# Altium integrated library 兰格封装.IntLib: 1176 symbols (part 5 of 6)
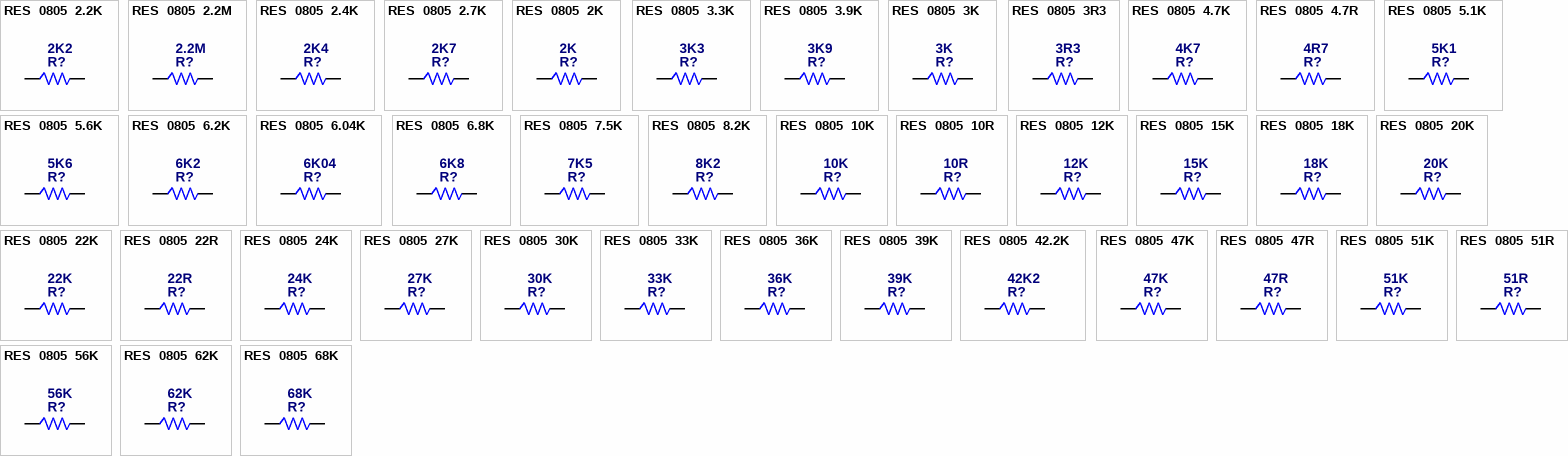
[diagram p52: symbols RES  0805  2.2K to RES  0805  68K]

## RES  0805  39K
designator R?, comment 39K
0805  39K  5%  HS  贴片电阻; 物料代码: 3.01.03.01.02.0043; 助记码: 0805  39K  5%  HS  TPDZ; 仓库名称: 元件仓; 单位: ֻ; 加工方式: 贴片; 物料名称: 0805  39K  5%  HS  贴片电阻; 规格型号: *
footprint R0805
pins: 1, 2
2 alternate drawings of the same symbol

## RES  0805  42.2K
designator R?, comment 42K2
0805 42.2K 1% HS 贴片电阻; 物料代码: 3.01.03.01.02.0074; 仓库名称: 元件仓; 助记码: 0805 42.2K 1% HS TPD; 单位: ֻ; 加工方式: 贴片; 物料名称: 0805 42.2K 1% HS 贴片电阻; 规格型号: *
footprint R0805
pins: 1, 2
2 alternate drawings of the same symbol

## RES  0805  47K
designator R?, comment 47K
0805  47K  5%  HS  贴片电阻; 物料代码: 3.01.03.01.02.0044; 仓库名称: 元件仓; 助记码: 0805  47K  5%  HS  TPDZ; 单位: ֻ; 加工方式: 贴片; 物料名称: 0805  47K  5%  HS  贴片电阻; 规格型号: *
footprint R0805
pins: 1, 2
2 alternate drawings of the same symbol

## RES  0805  47R
designator R?, comment 47R
0805  47R  5%  HS  贴片电阻; 物料代码: 3.01.03.01.02.0009; 单位: ֻ; 助记码: 0805  47R  5%  HS  TPDZ; 仓库名称: 元件仓; 加工方式: 贴片; 物料名称: 0805  47R  5%  HS  贴片电阻; 规格型号: *
footprint R0805
pins: 1, 2
2 alternate drawings of the same symbol

## RES  0805  51K
designator R?, comment 51K
0805  51K  5%  HS  贴片电阻; 物料代码: 3.01.03.01.02.0045; 仓库名称: 元件仓; 助记码: 0805  51K  5%  HS  TPDZ; 单位: ֻ; 加工方式: 贴片; 物料名称: 0805  51K  5%  HS  贴片电阻; 规格型号: *
footprint R0805
pins: 1, 2
2 alternate drawings of the same symbol

## RES  0805  51R
designator R?, comment 51R
0805  51R  5%  HS  贴片电阻; 助记码: 0805  51R  5%  HS  TPDZ; 单位: ֻ; 物料代码: 3.01.03.01.02.0064; 仓库名称: 元件仓; 加工方式: 贴片; 物料名称: 0805  51R  5%  HS  贴片电阻; 规格型号: *
footprint R0805
pins: 1, 2
2 alternate drawings of the same symbol

## RES  0805  56K
designator R?, comment 56K
0805 56K 5% HS 贴片电阻; 物料代码: 3.01.03.01.02.0046; 仓库名称: 元件仓; 助记码: 0805 56K 5% HS TPDZ; 单位: ֻ; 加工方式: 贴片; 物料名称: 0805 56K 5% HS 贴片电阻; 规格型号: *
footprint R0805
pins: 1, 2
2 alternate drawings of the same symbol

## RES  0805  62K
designator R?, comment 62K
0805 62K 5% HS 贴片电阻; 物料代码: 3.01.03.01.02.0047; 助记码: 0805 62K 5% HS TPDZ; 仓库名称: 元件仓; 单位: ֻ; 加工方式: 贴片; 物料名称: 0805 62K 5% HS 贴片电阻; 规格型号: *
footprint R0805
pins: 1, 2
2 alternate drawings of the same symbol

## RES  0805  68K
designator R?, comment 68K
0805  68K  5%  HS  贴片电阻; 物料代码: 3.01.03.01.02.0048; 助记码: 0805  68K  5%  HS  TPDZ; 仓库名称: 元件仓; 单位: ֻ; 加工方式: 贴片; 物料名称: 0805  68K  5%  HS  贴片电阻; 规格型号: *
footprint R0805
pins: 1, 2
2 alternate drawings of the same symbol

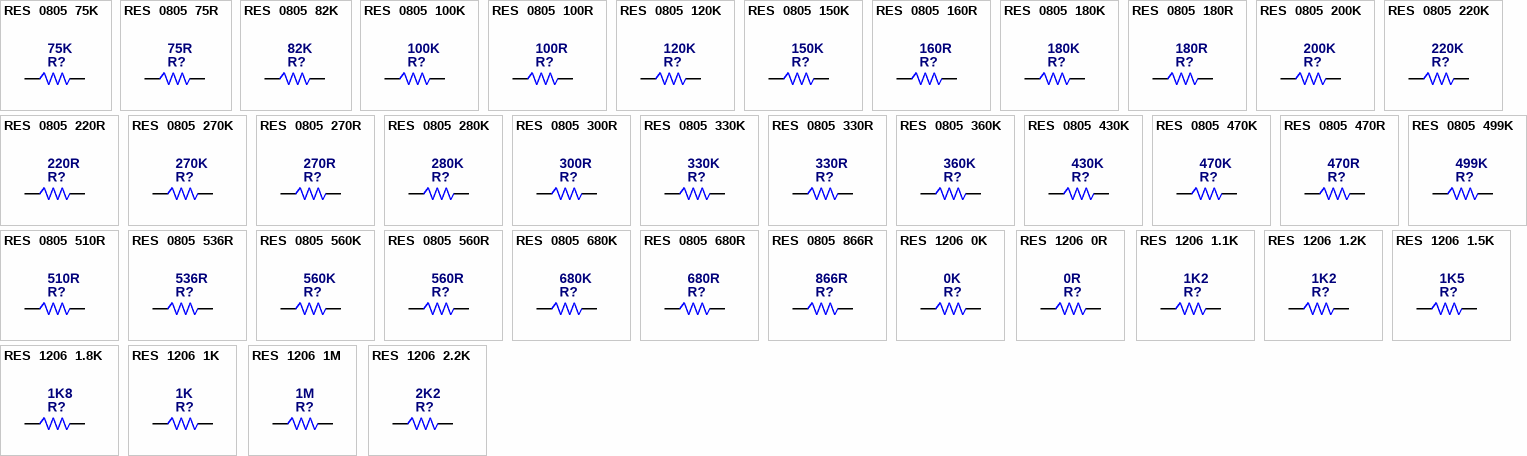
[diagram p40: symbols RES  0805  75K to RES  1206  2.2K]

## RES  0805  75K
designator R?, comment 75K
0805 75K 5% HS 贴片电阻; 物料代码: 3.01.03.01.02.0049; 助记码: 0805 75K 5% HS TPDZ; 仓库名称: 元件仓; 单位: ֻ; 加工方式: 贴片; 物料名称: 0805 75K 5% HS 贴片电阻; 规格型号: *
footprint R0805
pins: 1, 2
2 alternate drawings of the same symbol

## RES  0805  75R
designator R?, comment 75R
0805 75R 5% HS贴片电阻; 物料代码: 3.01.03.01.02.0010; 助记码: 0805 75R 5% HSTPDZ; 仓库名称: 元件仓; 单位: ֻ; 加工方式: 贴片; 物料名称: 0805 75R 5% HS贴片电阻; 规格型号: *
footprint R0805
pins: 1, 2
2 alternate drawings of the same symbol

## RES  0805  82K
designator R?, comment 82K
0805 82K 5% HS 贴片电阻; 物料代码: 3.01.03.01.02.0050; 助记码: 0805 82K 5% HS TPDZ; 仓库名称: 元件仓; 单位: ֻ; 加工方式: 贴片; 物料名称: 0805 82K 5% HS 贴片电阻; 规格型号: *
footprint R0805
pins: 1, 2
2 alternate drawings of the same symbol

## RES  0805  100K
designator R?, comment 100K
0805  100K  5%  HS  贴片电阻; 助记码: 0805  100K  5%  HS  TPDZ; 物料代码: 3.01.03.01.02.0005; 仓库名称: 元件仓; 单位: ֻ; 加工方式: 贴片; 物料名称: 0805  100K  5%  HS  贴片电阻; 规格型号: *
footprint R0805
pins: 1, 2
2 alternate drawings of the same symbol

## RES  0805  100R
designator R?, comment 100R
0805  100R  5%  HS  贴片电阻; 物料代码: 3.01.03.01.02.0011; 仓库代码: 元件仓; 助记码: 0805  100R  5%  HS  TPDZ; 单位: ֻ; 加工方式: 贴片; 仓库名称: 0805  100R  5%  HS  贴片电阻; 规格型号: *
footprint R0805
pins: 1, 2
2 alternate drawings of the same symbol

## RES  0805  120K
designator R?, comment 120K
0805  120K  5%  HS  贴片电阻; 助记码: 0805  120K  5%  HS  TPDZ; 物料代码: 3.01.03.01.02.0051; 仓库名称: 元件仓; 单位: ֻ; 加工方式: 贴片; 物料名称: 0805  120K  5%  HS  贴片电阻; 规格型号: *
footprint R0805
pins: 1, 2
2 alternate drawings of the same symbol

## RES  0805  150K
designator R?, comment 150K
0805  150K  5%  HS  贴片电阻; 助记码: 0805  150K  5%  HS  TPDZ; 物料代码: 3.01.03.01.02.0052; 仓库名称: 元件仓; 单位: ֻ; 加工方式: 贴片; 物料名称: 0805  150K  5%  HS  贴片电阻; 规格型号: *
footprint R0805
pins: 1, 2
2 alternate drawings of the same symbol

## RES  0805  160R
designator R?, comment 160R
0805 160R 5% HS 贴片电阻; 物料代码: 3.01.03.01.02.0068; 仓库名称: 元件仓; 助记码: 0805 160R 5% HS TPDZ; 单位: ֻ; 加工方式: 贴片; 物料名称: 0805 160R 5% HS 贴片电阻; 规格型号: *
footprint R0805
pins: 1, 2
2 alternate drawings of the same symbol

## RES  0805  180K
designator R?, comment 180K
0805 180K 5% HS 贴片电阻; 助记码: 0805 180K 5% HS TPDZ; 物料代码: 3.01.03.01.02.0053; 仓库名称: 元件仓; 单位: ֻ; 加工方式: 贴片; 物料名称: 0805 180K 5% HS 贴片电阻; 规格型号: *
footprint R0805
pins: 1, 2
2 alternate drawings of the same symbol

## RES  0805  180R
designator R?, comment 180R
0805 180R 5% HS 贴片电阻; 助记码: 0805 180R 5% HS TPDZ; 物料代码: 3.01.03.01.02.0069; 仓库名称: 元件仓; 单位: ֻ; 加工方式: 贴片; 物料名称: 0805 180R 5% HS 贴片电阻; 规格型号: *
footprint R0805
pins: 1, 2
2 alternate drawings of the same symbol

## RES  0805  200K
designator R?, comment 200K
0805 200K 5% HS 贴片电阻; 物料代码: 3.01.03.01.02.0054; 助记码: 0805 200K 5% HS TPDZ; 仓库名称: 元件仓; 单位: ֻ; 加工方式: 贴片; 物料名称: 0805 200K 5% HS 贴片电阻; 规格型号: *
footprint R0805
pins: 1, 2
2 alternate drawings of the same symbol

## RES  0805  220K
designator R?, comment 220K
0805  220K  5%  HS  贴片电阻; 物料代码: 3.01.03.01.02.0055; 助记码: 0805  220K  5%  HS  TPDZ; 仓库名称: 元件仓; 单位: ֻ; 加工方式: 贴片; 物料名称: 0805  220K  5%  HS  贴片电阻; 规格型号: *
footprint R0805
pins: 1, 2
2 alternate drawings of the same symbol

## RES  0805  220R
designator R?, comment 220R
0805  220R  5%  HS  贴片电阻; 物料代码: 3.01.03.01.02.0012; 助记码: 0805  220R  5%  HS  TPDZ; 仓库名称: 元件仓; 单位: ֻ; 加工方式: 贴片; 物料名称: 0805  220R  5%  HS  贴片电阻; 规格型号: *
footprint R0805
pins: 1, 2
2 alternate drawings of the same symbol

## RES  0805  270K
designator R?, comment 270K
0805  270K  5%  HS  贴片电阻; 助记码: 0805  270K  5%  HS  TPDZ; 仓库名称: 元件仓; 物料代码: 3.01.03.01.02.0056; 单位: ֻ; 加工方式: 贴片; 物料名称: 0805  270K  5%  HS  贴片电阻; 规格型号: *
footprint R0805
pins: 1, 2
2 alternate drawings of the same symbol

## RES  0805  270R
designator R?, comment 270R
0805  270R  5%  HS  贴片电阻; 物料代码: 3.01.03.01.02.0013; 助记码: 0805  270R  5%  HS  TPDZ; 仓库名称: 元件仓; 单位: ֻ; 加工方式: 贴片; 物料名称: 0805  270R  5%  HS  贴片电阻; 规格型号: *
footprint R0805
pins: 1, 2
2 alternate drawings of the same symbol

## RES  0805  280K
designator R?, comment 280K
0805 280K 1% HS 贴片电阻; 助记码: 0805 280K 1% HS TPDZ; 仓库名称: 元件仓; 物料代码: 3.01.03.01.02.0075; 单位: ֻ; 加工方式: 贴片; 物料名称: 0805 280K 1% HS 贴片电阻; 规格型号: *
footprint R0805
pins: 1, 2
2 alternate drawings of the same symbol

## RES  0805  300R
designator R?, comment 300R
0805 300R 5% HS 贴片电阻; 物料代码: 3.01.03.01.02.0014; 助记码: 0805 300R 5% HS TPDZ; 仓库名称: 元件仓; 单位: ֻ; 加工方式: 贴片; 物料名称: 0805 300R 5% HS 贴片电阻; 规格型号: *
footprint R0805
pins: 1, 2
2 alternate drawings of the same symbol

## RES  0805  330K
designator R?, comment 330K
0805  330K  5%  HS  贴片电阻; 助记码: 0805  330K  5%  HS  TPDZ; 物料代码: 3.01.03.01.02.0057; 仓库名称: 元件仓; 单位: ֻ; 加工方式: 贴片; 物料名称: 0805  330K  5%  HS  贴片电阻; 规格型号: *
footprint R0805
pins: 1, 2
2 alternate drawings of the same symbol

## RES  0805  330R
designator R?, comment 330R
0805  330R  5%  HS  贴片电阻; 物料代码: 3.01.03.01.02.0015; 助记码: 0805  330R  5%  HS  TPDZ; 仓库名称: 元件仓; 单位: ֻ; 加工方式: 贴片; 物料名称: 0805  330R  5%  HS  贴片电阻; 规格型号: *
footprint R0805
pins: 1, 2
2 alternate drawings of the same symbol

## RES  0805  360K
designator R?, comment 360K
0805 360K 5% HS 贴片电阻; 助记码: 0805 360K 5% HS TPDZ; 物料代码: 3.01.03.01.02.0058; 仓库名称: 元件仓; 单位: ֻ; 加工方式: 贴片; 物料名称: 0805 360K 5% HS 贴片电阻; 规格型号: *
footprint R0805
pins: 1, 2
2 alternate drawings of the same symbol

## RES  0805  430K
designator R?, comment 430K
0805  430K  5%  HS  贴片电阻; 助记码: 0805  430K  5%  HS  TPDZ; 物料代码: 3.01.03.01.02.0059; 仓库名称: 元件仓; 单位: ֻ; 加工方式: 贴片; 物料名称: 0805  430K  5%  HS  贴片电阻; 规格型号: *
footprint R0805
pins: 1, 2
2 alternate drawings of the same symbol

## RES  0805  470K
designator R?, comment 470K
0805 470K 5% HS 贴片电阻; 物料代码: 3.01.03.01.02.0060; 助记码: 0805 470K 5% HS TPDZ; 仓库名称: 元件仓; 单位: ֻ; 加工方式: 贴片; 物料名称: 0805 470K 5% HS 贴片电阻; 规格型号: *
footprint R0805
pins: 1, 2
2 alternate drawings of the same symbol

## RES  0805  470R
designator R?, comment 470R
0805  470R  5%  HS  贴片电阻; 物料代码: 3.01.03.01.02.0016; 助记码: 0805  470R  5%  HS  TPDZ; 仓库名称: 元件仓; 单位: ֻ; 加工方式: 贴片; 物料名称: 0805  470R  5%  HS  贴片电阻; 规格型号: *
footprint R0805
pins: 1, 2
2 alternate drawings of the same symbol

## RES  0805  499K
designator R?, comment 499K
0805 499K 1% HS 贴片电阻; 物料代码: 3.01.03.01.02.0077; 助记码: 0805 499K 1% HS TPDZ; 仓库名称: 元件仓; 单位: ֻ; 加工方式: 贴片; 物料名称: 0805 499K 1% HS 贴片电阻; 规格型号: *
footprint R0805
pins: 1, 2
2 alternate drawings of the same symbol

## RES  0805  510R
designator R?, comment 510R
0805 510R 1% HS 贴片电阻; 物料代码: 3.01.03.01.02.0076; 仓库名称: 元件仓; 助记码: 0805  510R  5%  HS  TPDZ; 单位: ֻ; 加工方式: 贴片; 物料名称: 0805 510R 1% HS 贴片电阻; 规格型号: *
footprint R0805
pins: 1, 2
2 alternate drawings of the same symbol

## RES  0805  536R
designator R?, comment 536R
0805 536R 1% HS 贴片电阻; 物料代码: 3.01.03.01.02.0070; 仓库名称: 元件仓; 助记码: 0805 536R 1% HS TPDZ; 单位: ֻ; 加工方式: 贴片; 物料名称: 0805 536R 1% HS 贴片电阻; 规格型号: *
footprint R0805
pins: 1, 2
2 alternate drawings of the same symbol

## RES  0805  560K
designator R?, comment 560K
0805 560K 5% HS  贴片电阻; 物料代码: 3.01.03.01.02.0061; 仓库名称: 元件仓; 助记码: 0805 560K 5% HS  TPDZ; 单位: ֻ; 加工方式: 贴片; 物料名称: 0805 560K 5% HS  贴片电阻; 规格型号: *
footprint R0805
pins: 1, 2
2 alternate drawings of the same symbol

## RES  0805  560R
designator R?, comment 560R
0805  560R  5%  HS  贴片电阻; 物料代码: 3.01.03.01.02.0017; 仓库名称: 元件仓; 助记码: 0805  560R  5%  HS  TPDZ; 单位: ֻ; 加工方式: 贴片; 物料名称: 0805  560R  5%  HS  贴片电阻; 规格型号: *
footprint R0805
pins: 1, 2
2 alternate drawings of the same symbol

## RES  0805  680K
designator R?, comment 680K
0805 680K 5% HS 贴片电阻; 物料代码: 3.01.03.01.02.0062; 助记码: 0805 680K 5% HS TPDZ; 仓库名称: 元件仓; 单位: ֻ; 加工方式: 贴片; 物料名称: 0805 680K 5% HS 贴片电阻; 规格型号: *
footprint R0805
pins: 1, 2
2 alternate drawings of the same symbol

## RES  0805  680R
designator R?, comment 680R
0805  680R  5%  HS  贴片电阻; 物料代码: 3.01.03.01.02.0018; 助记码: 0805  680R  5%  HS  TPDZ; 仓库名称: 元件仓; 单位: ֻ; 加工方式: 贴片; 物料名称: 0805  680R  5%  HS  贴片电阻; 规格型号: *
footprint R0805
pins: 1, 2
2 alternate drawings of the same symbol

## RES  0805  866R
designator R?, comment 866R
0805 866R 1% HS 贴片电阻; 物料代码: 3.01.03.01.02.0071; 助记码: 0805 866R 1% HS TPDZ; 仓库名称: 元件仓; 单位: ֻ; 加工方式: 贴片; 物料名称: 0805 866R 1% HS 贴片电阻; 规格型号: *
footprint R0805
pins: 1, 2
2 alternate drawings of the same symbol

## RES  1206  0K
designator R?, comment 0K
1206  0K  5%  HS  贴片电阻; 加工方式: 贴片
footprint R1206
pins: 1, 2
2 alternate drawings of the same symbol

## RES  1206  0R
designator R?, comment 0R
1206  0R  5%  贴片电阻; 物料代码: 3.01.03.01.05.0001; 仓库名称: 元件仓; 单位: ֻ; 加工方式: 贴片; 物料名称: 1206  0R  5%  贴片电阻; 规格型号: *
footprint R1206
pins: 1, 2
2 alternate drawings of the same symbol

## RES  1206  1.1K
designator R?, comment 1K2
1206 1.1K 1% HS 贴片电阻; 物料代码: 3.01.03.01.05.0061; 助记码: 1206 1.1K 1% HS TPDZ; 仓库名称: 元件仓; 单位: ֻ; 加工方式: 贴片; 物料名称: 1206 1.1K 1% HS 贴片电阻; 规格型号: *
footprint R1206
pins: 1, 2
2 alternate drawings of the same symbol

## RES  1206  1.2K
designator R?, comment 1K2
1206  1.2K  5%  HS  贴片电阻; 物料代码: 3.01.03.01.05.0016; 助记码: 1206  1.2K  5%  HS  TPDZ; 仓库名称: 元件仓; 单位: ֻ; 加工方式: 贴片; 物料名称: 1206  1.2K  5%  HS  贴片电阻; 规格型号: *
footprint R1206
pins: 1, 2
2 alternate drawings of the same symbol

## RES  1206  1.5K
designator R?, comment 1K5
1206  1.5K  5%  HS  贴片电阻; 助记码: 1206  1.5K  5%  HS  TPDZ; 物料代码: 3.01.03.01.05.0059; 仓库名称: 元件仓; 单位: ֻ; 加工方式: 贴片; 物料名称: 1206  1.5K  5%  HS  贴片电阻; 规格型号: *
footprint R1206
pins: 1, 2
2 alternate drawings of the same symbol

## RES  1206  1.8K
designator R?, comment 1K8
1206 1.8K 5% HS 贴片电阻; 助记码: 1206 1.8K 5% HS TPDZ; 仓库名称: 元件仓; 物料代码: 3.01.03.01.05.0017; 单位: ֻ; 加工方式: 贴片; 物料名称: 1206 1.8K 5% HS 贴片电阻; 规格型号: *
footprint R1206
pins: 1, 2
2 alternate drawings of the same symbol

## RES  1206  1K
designator R?, comment 1K
1206  1K  5%  HS  贴片电阻; 物料代码: 3.01.03.01.05.0015; 助记码: 1206  1K  5%  HS  TPDZ; 仓库名称: 元件仓; 单位: ֻ; 加工方式: 贴片; 物料名称: 1206  1K  5%  HS  贴片电阻; 规格型号: *
footprint R1206
pins: 1, 2
2 alternate drawings of the same symbol

## RES  1206  1M
designator R?, comment 1M
1206 1M 5% HS 贴片电阻; 物料代码: 3.01.03.01.05.0056; 助记码: 1206 1M 5% HS TPDZ; 仓库名称: 元件仓; 单位: ֻ; 加工方式: 贴片; 物料名称: 1206 1M 5% HS 贴片电阻; 规格型号: *
footprint R1206
pins: 1, 2
2 alternate drawings of the same symbol

## RES  1206  2.2K
designator R?, comment 2K2
1206  2.2K  5%  HS  贴片电阻; 物料代码: 3.01.03.01.05.0057; 助记码: 1206  2.2K  5%  HS  TPDZ; 仓库名称: 元件仓; 单位: ֻ; 加工方式: 贴片; 物料名称: 1206  2.2K  5%  HS  贴片电阻; 规格型号: *
footprint R1206
pins: 1, 2
2 alternate drawings of the same symbol

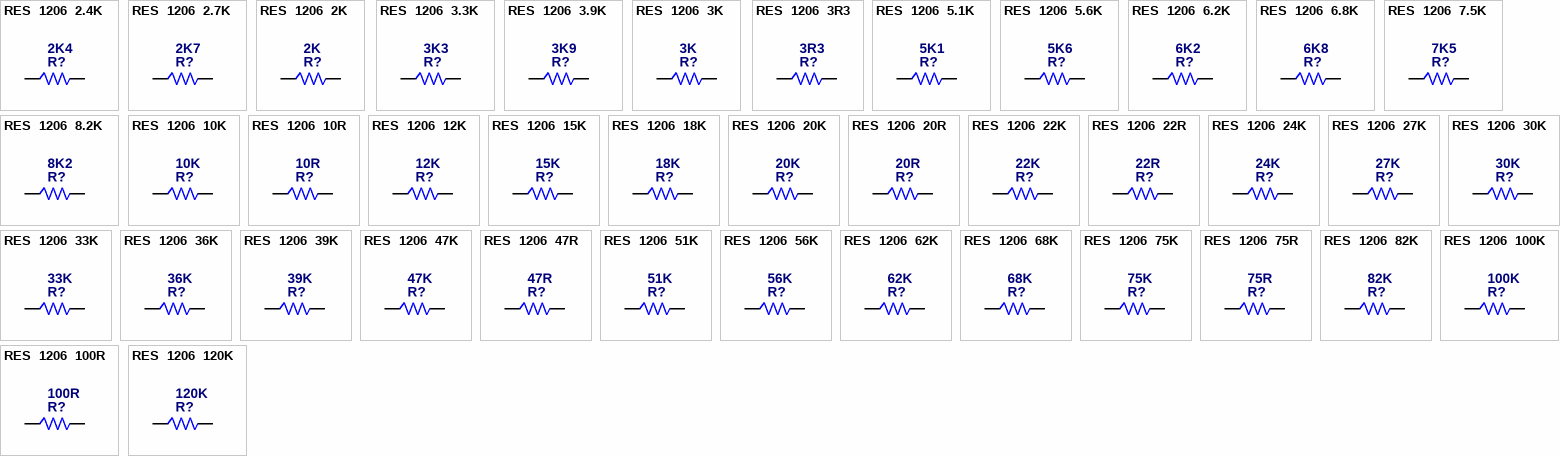
[diagram p41: symbols RES  1206  2.4K to RES  1206  120K]

## RES  1206  2.4K
designator R?, comment 2K4
1206 2.4K 5% HS贴片电阻; 物料代码: 3.01.03.01.05.0058; 助记码: 1206 2.4K 5%TPDZ; 仓库名称: 元件仓; 单位: ֻ; 加工方式: 贴片; 物料名称: 1206 2.4K 5% HS贴片电阻; 规格型号: *
footprint R1206
pins: 1, 2
2 alternate drawings of the same symbol

## RES  1206  2.7K
designator R?, comment 2K7
1206  2.7K  5%  HS  贴片电阻; 物料代码: 3.01.03.01.05.0006; 助记码: 1206  2.7K  5%  HS  TPDZ; 仓库名称: 元件仓; 单位: ֻ; 加工方式: 贴片; 物料名称: 1206  2.7K  5%  HS  贴片电阻; 规格型号: *
footprint R1206
pins: 1, 2
2 alternate drawings of the same symbol

## RES  1206  2K
designator R?, comment 2K
1206  2K  5%  HS  贴片电阻; 物料代码: 3.01.03.01.05.0018; 助记码: 1206  2K  5%  HS  TPDZ; 仓库名称: 元件仓; 单位: ֻ; 加工方式: 贴片; 物料名称: 1206  2K  5%  HS  贴片电阻; 规格型号: *
footprint R1206
pins: 1, 2
2 alternate drawings of the same symbol

## RES  1206  3.3K
designator R?, comment 3K3
1206 3.3K 5% HS 贴片电阻; 加工方式: 贴片; 物料代码: 3.01.03.01.05.0062; 助记码: 1206 3.3K 5% HS TPDZ; 单位: ֻ; 仓库名称: 元件仓; 物料名称: 1206 3.3K 5% HS 贴片电阻; 规格型号: *; 备注: *
footprint R1206
pins: 1, 2
2 alternate drawings of the same symbol

## RES  1206  3.9K
designator R?, comment 3K9
（查不到）1206  3.9K  5%  HS  贴片电阻; 加工方式: 贴片; 单位: ֻ; 仓库名称: 元件仓; 物料代码: *; 物料名称: *; 助记码: *; 规格型号: *; 备注: *
footprint R1206
pins: 1, 2
2 alternate drawings of the same symbol

## RES  1206  3K
designator R?, comment 3K
1206 3K 5% HS 贴片电阻; 加工方式: 贴片; 物料代码: 3.01.03.01.05.0019; 助记码: 1206 3K 5% HS TPDZ; 单位: ֻ; 仓库名称: 元件仓; 物料名称: 1206 3K 5% HS 贴片电阻; 规格型号: *; 备注: *
footprint R1206
pins: 1, 2
2 alternate drawings of the same symbol

## RES  1206  3R3
designator R?, comment 3R3
1206  3R3  5%  HS  贴片电阻; 物料代码: 3.01.03.01.05.0007; 助记码: 1206  3R3  5%  HS  TPDZ; 仓库名称: 元件仓; 单位: ֻ; 加工方式: 贴片; 物料名称: 1206  3R3  5%  HS  贴片电阻; 规格型号: *
footprint R1206
pins: 1, 2
2 alternate drawings of the same symbol

## RES  1206  5.1K
designator R?, comment 5K1
1206 5.1K 5% HS 贴片电阻; 物料代码: 3.01.03.01.05.0021; 助记码: 1206 5.1K 5% HS TPDZ; 仓库名称: 元件仓; 单位: ֻ; 加工方式: 贴片; 物料名称: 1206 5.1K 5% HS 贴片电阻; 规格型号: *
footprint R1206
pins: 1, 2
2 alternate drawings of the same symbol

## RES  1206  5.6K
designator R?, comment 5K6
1206 5.6K 5% HS 贴片电阻; 物料代码: 3.01.03.01.05.0022; 助记码: 1206 5.6K 5% HS TPDZ; 仓库名称: 元件仓; 单位: ֻ; 加工方式: 贴片; 物料名称: 1206 5.6K 5% HS 贴片电阻; 规格型号: *
footprint R1206
pins: 1, 2
2 alternate drawings of the same symbol

## RES  1206  6.2K
designator R?, comment 6K2
1206 6.2K 5% HS 贴片电阻; 物料代码: 3.01.03.01.05.0023; 助记码: 1206 6.2K 5% HS TPDZ; 仓库名称: 元件仓; 单位: ֻ; 加工方式: 贴片; 物料名称: 1206 6.2K 5% HS 贴片电阻; 规格型号: *
footprint R1206
pins: 1, 2
2 alternate drawings of the same symbol

## RES  1206  6.8K
designator R?, comment 6K8
1206 6.8K 5% HS 贴片电阻; 物料代码: 3.01.03.01.05.0024; 助记码: 1206 6.8K 5% HS TPDZ; 仓库名称: 元件仓; 单位: ֻ; 加工方式: 贴片; 物料名称: 1206 6.8K 5% HS 贴片电阻; 规格型号: *
footprint R1206
pins: 1, 2
2 alternate drawings of the same symbol

## RES  1206  7.5K
designator R?, comment 7K5
1206  7K5  5%  HS  贴片电阻; 物料代码: 3.01.03.01.05.0029; 助记码: 1206  7K5  5%  HS  TPDZ; 仓库名称: 元件仓; 单位: ֻ; 加工方式: 贴片; 物料名称: 1206  7K5  5%  HS  贴片电阻; 规格型号: *
footprint R1206
pins: 1, 2
2 alternate drawings of the same symbol

## RES  1206  8.2K
designator R?, comment 8K2
1206 8.2K 5% HS 贴片电阻; 物料代码: 3.01.03.01.05.0030; 助记码: 1206 8.2K 5% HS TPDZ; 仓库名称: 元件仓; 单位: ֻ; 加工方式: 贴片; 物料名称: 1206 8.2K 5% HS 贴片电阻; 规格型号: *
footprint R1206
pins: 1, 2
2 alternate drawings of the same symbol

## RES  1206  10K
designator R?, comment 10K
1206 10K 5% HS 贴片电阻; 助记码: 1206 10K 5% HS TPDZ; 物料代码: 3.01.03.01.05.0025; 单位: ֻ; 仓库名称: 元件仓; 加工方式: 贴片; 物料名称: 1206 10K 5% HS 贴片电阻; 规格型号: *
footprint R1206
pins: 1, 2
2 alternate drawings of the same symbol

## RES  1206  10R
designator R?, comment 10R
1206 10R 5% HS 贴片电阻; 助记码: 1206 10R 5% HS TPDZ; 物料代码: 3.01.03.01.05.0008; 单位: ֻ; 仓库名称: 元件仓; 加工方式: 贴片; 物料名称: 1206 10R 5% HS 贴片电阻; 规格型号: *
footprint R1206
pins: 1, 2
2 alternate drawings of the same symbol

## RES  1206  12K
designator R?, comment 12K
1206 12K 5% HS 贴片电阻; 助记码: 1206 12K 5% HS TPDZ; 物料代码: 3.01.03.01.05.0026; 单位: ֻ; 仓库名称: 元件仓; 加工方式: 贴片; 物料名称: 1206 12K 5% HS 贴片电阻; 规格型号: *
footprint R1206
pins: 1, 2
2 alternate drawings of the same symbol

## RES  1206  15K
designator R?, comment 15K
1206 15K 5% HS 贴片电阻; 助记码: 1206 15K 5% HS TPDZ; 物料代码: 3.01.03.01.05.0027; 单位: ֻ; 仓库名称: 元件仓; 加工方式: 贴片; 物料名称: 1206 15K 5% HS 贴片电阻; 规格型号: *
footprint R1206
pins: 1, 2
2 alternate drawings of the same symbol

## RES  1206  18K
designator R?, comment 18K
1206 18K 5% HS 贴片电阻; 助记码: 1206 18K 5% HS TPDZ; 物料代码: 3.01.03.01.05.0028; 单位: ֻ; 仓库名称: 元件仓; 加工方式: 贴片; 物料名称: 1206 18K 5% HS 贴片电阻; 规格型号: *
footprint R1206
pins: 1, 2
2 alternate drawings of the same symbol

## RES  1206  20K
designator R?, comment 20K
1206  20K  5%  HS  贴片电阻; 助记码: 1206  20K  5%  HS  TPDZ; 物料代码: 3.01.03.01.05.0005; 单位: ֻ; 仓库名称: 元件仓; 加工方式: 贴片; 物料名称: 1206  20K  5%  HS  贴片电阻; 规格型号: *
footprint R1206
pins: 1, 2
2 alternate drawings of the same symbol

## RES  1206  20R
designator R?, comment 20R
1206 20R 5% HS 贴片电阻; 助记码: 1206 20R 5% HS TPDZ; 物料代码: 3.01.03.01.05.0060; 单位: ֻ; 仓库名称: 元件仓; 加工方式: 贴片; 物料名称: 1206 20R 5% HS 贴片电阻; 规格型号: *
footprint R1206
pins: 1, 2
2 alternate drawings of the same symbol

## RES  1206  22K
designator R?, comment 22K
1206 22K 5% HS 贴片电阻; 物料代码: 3.01.03.01.05.0031; 仓库名称: 元件仓; 助记码: 1206 22K 5% HS TPDZ; 单位: ֻ; 加工方式: 贴片; 物料名称: 1206 22K 5% HS 贴片电阻; 规格型号: *
footprint R1206
pins: 1, 2
2 alternate drawings of the same symbol

## RES  1206  22R
designator R?, comment 22R
1206  22R  5%  HS  贴片电阻; 物料代码: 3.01.03.01.05.0002; 仓库名称: 元件仓; 单位: ֻ; 加工方式: 贴片; 物料名称: 1206  22R  5%  HS  贴片电阻; 规格型号: *
footprint R1206
pins: 1, 2
2 alternate drawings of the same symbol

## RES  1206  24K
designator R?, comment 24K
1206 24K 5% HS 贴片电阻; 物料代码: 3.01.03.01.05.0032; 仓库名称: 元件仓; 助记码: 1206 24K 5% HS TPDZ; 单位: ֻ; 加工方式: 贴片; 物料名称: 1206 24K 5% HS 贴片电阻; 规格型号: *
footprint R1206
pins: 1, 2
2 alternate drawings of the same symbol

## RES  1206  27K
designator R?, comment 27K
1206 27K 5% HS 贴片电阻; 物料代码: 3.01.03.01.05.0033; 仓库名称: 元件仓; 助记码: 1206 27K 5% HS TPDZ; 单位: ֻ; 加工方式: 贴片; 物料名称: 1206 27K 5% HS 贴片电阻; 规格型号: *
footprint R1206
pins: 1, 2
2 alternate drawings of the same symbol

## RES  1206  30K
designator R?, comment 30K
1206 30K 5% HS 贴片电阻; 助记码: 1206 30K 5% HS TPDZ; 物料代码: 3.01.03.01.05.0034; 单位: ֻ; 仓库名称: 元件仓; 加工方式: 贴片; 物料名称: 1206 30K 5% HS 贴片电阻; 规格型号: *
footprint R1206
pins: 1, 2
2 alternate drawings of the same symbol

## RES  1206  33K
designator R?, comment 33K
1206 33K 5% HS 贴片电阻; 助记码: 1206 33K 5% HS TPDZ; 物料代码: 3.01.03.01.05.0035; 单位: ֻ; 仓库名称: 元件仓; 加工方式: 贴片; 物料名称: 1206 33K 5% HS 贴片电阻; 规格型号: *
footprint R1206
pins: 1, 2
2 alternate drawings of the same symbol

## RES  1206  36K
designator R?, comment 36K
1206 36K 5% HS 贴片电阻; 助记码: 1206 36K 5% HS TPDZ; 物料代码: 3.01.03.01.05.0036; 仓库名称: 元件仓; 单位: ֻ; 加工方式: 贴片; 物料名称: 1206 36K 5% HS 贴片电阻; 规格型号: *
footprint R1206
pins: 1, 2
2 alternate drawings of the same symbol

## RES  1206  39K
designator R?, comment 39K
1206 39K 5% HS 贴片电阻; 助记码: 1206 39K 5% HS TPDZ; 物料代码: 3.01.03.01.05.0037; 仓库名称: 元件仓; 单位: ֻ; 加工方式: 贴片; 物料名称: 1206 39K 5% HS 贴片电阻; 规格型号: *
footprint R1206
pins: 1, 2
2 alternate drawings of the same symbol

## RES  1206  47K
designator R?, comment 47K
1206  47K  5%  HS  贴片电阻; 物料代码: 3.01.03.01.05.0038; 助记码: 1206 47K 5% HS TPDZ; 仓库名称: 元件仓; 单位: ֻ; 加工方式: 贴片; 物料名称: 1206  47K  5%  HS  贴片电阻; 规格型号: *
footprint R1206
pins: 1, 2
2 alternate drawings of the same symbol

## RES  1206  47R
designator R?, comment 47R
1206 47R 5% HS 贴片电阻; 物料代码: 3.01.03.01.05.0009; 助记码: 1206 47R 5% HS TPDZ; 仓库名称: 元件仓; 单位: ֻ; 加工方式: 贴片; 物料名称: 1206 47R 5% HS 贴片电阻; 规格型号: *
footprint R1206
pins: 1, 2
2 alternate drawings of the same symbol

## RES  1206  51K
designator R?, comment 51K
1206 51K 5% HS 贴片电阻; 物料代码: 3.01.03.01.05.0039; 助记码: 1206 51K 5% HS TPDZ; 仓库名称: 元件仓; 单位: ֻ; 加工方式: 贴片; 物料名称: 1206 51K 5% HS 贴片电阻; 规格型号: *
footprint R1206
pins: 1, 2
2 alternate drawings of the same symbol

## RES  1206  56K
designator R?, comment 56K
1206 56K 5% HS 贴片电阻; 物料代码: 3.01.03.01.05.0040; 助记码: 1206 56K 5% HS TPDZ; 仓库名称: 元件仓; 单位: ֻ; 加工方式: 贴片; 物料名称: 1206 56K 5% HS 贴片电阻; 规格型号: *
footprint R1206
pins: 1, 2
2 alternate drawings of the same symbol

## RES  1206  62K
designator R?, comment 62K
1206 62K 5% HS 贴片电阻; 物料代码: 3.01.03.01.05.0041; 助记码: 1206 62K 5% HS TPDZ; 仓库名称: 元件仓; 单位: ֻ; 加工方式: 贴片; 物料名称: 1206 62K 5% HS 贴片电阻; 规格型号: *
footprint R1206
pins: 1, 2
2 alternate drawings of the same symbol

## RES  1206  68K
designator R?, comment 68K
1206 68K 5% HS 贴片电阻; 物料代码: 3.01.03.01.05.0042; 助记码: 1206 68K 5% HS TPDZ; 仓库名称: 元件仓; 单位: ֻ; 加工方式: 贴片; 物料名称: 1206 68K 5% HS 贴片电阻; 规格型号: *
footprint R1206
pins: 1, 2
2 alternate drawings of the same symbol

## RES  1206  75K
designator R?, comment 75K
1206 75K 5% HS 贴片电阻; 物料代码: 3.01.03.01.05.0043; 助记码: 1206 75K 5% HS TPDZ; 仓库名称: 元件仓; 单位: ֻ; 加工方式: 贴片; 物料名称: 1206 75K 5% HS 贴片电阻; 规格型号: *
footprint R1206
pins: 1, 2
2 alternate drawings of the same symbol

## RES  1206  75R
designator R?, comment 75R
1206 75R 5% HS 贴片电阻; 物料代码: 3.01.03.01.05.0010; 助记码: 1206 75R 5% HS TPDZ; 仓库名称: 元件仓; 单位: ֻ; 加工方式: 贴片; 物料名称: 1206 75R 5% HS 贴片电阻; 规格型号: *
footprint R1206
pins: 1, 2
2 alternate drawings of the same symbol

## RES  1206  82K
designator R?, comment 82K
1206 82K 5% HS 贴片电阻; 物料代码: 3.01.03.01.05.0044; 助记码: 1206 82K 5% HS TPDZ; 仓库名称: 元件仓; 单位: ֻ; 加工方式: 贴片; 物料名称: 1206 82K 5% HS 贴片电阻; 规格型号: *
footprint R1206
pins: 1, 2
2 alternate drawings of the same symbol

## RES  1206  100K
designator R?, comment 100K
1206  100K  5%  HS  贴片电阻; 物料名称: 1206 100K 5% 贴片电阻; 物料代码: 3.01.03.01.05.0004; 助记码: 1206 100K 5% TPDZ; 仓库名称: 元件仓; 单位: ֻ; 加工方式: 贴片; 规格型号: *
footprint R1206
pins: 1, 2
2 alternate drawings of the same symbol

## RES  1206  100R
designator R?, comment 100R
1206 100R 5% HS 贴片电阻; 物料代码: 3.01.03.01.05.0066; 助记码: 1206 100R 5% HS TPDZ; 仓库名称: 元件仓; 单位: ֻ; 加工方式: 贴片; 物料名称: 1206 100R 5% HS 贴片电阻; 规格型号: *
footprint R1206
pins: 1, 2
2 alternate drawings of the same symbol

## RES  1206  120K
designator R?, comment 120K
1206 120K 5% HS 贴片电阻; 物料代码: 3.01.03.01.05.0045; 助记码: 1206 120K 5% HS TPDZ; 仓库名称: 元件仓; 单位: ֻ; 加工方式: 贴片; 物料名称: 1206 120K 5% HS 贴片电阻; 规格型号: *
footprint R1206
pins: 1, 2
2 alternate drawings of the same symbol

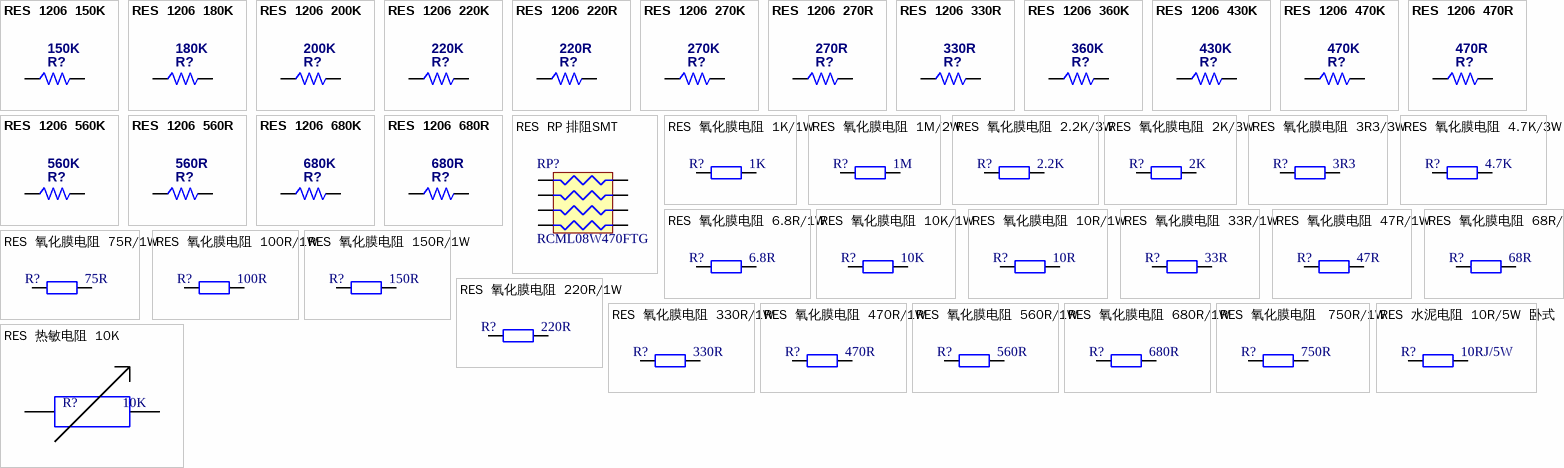
[diagram p42: symbols RES  1206  150K to RES  热敏电阻  10K]

## RES  1206  150K
designator R?, comment 150K
1206  150K  5%  HS  贴片电阻; 物料代码: 3.01.03.01.05.0046; 助记码: 1206 150K 5% HS TPDZ; 仓库名称: 元件仓; 单位: ֻ; 加工方式: 贴片; 物料名称: 1206  150K  5%  HS  贴片电阻; 规格型号: *
footprint R1206
pins: 1, 2
2 alternate drawings of the same symbol

## RES  1206  180K
designator R?, comment 180K
1206 180K 5% HS 贴片电阻; 物料代码: 3.01.03.01.05.0047; 助记码: 1206 180K 5% HS TPDZ; 仓库名称: 元件仓; 单位: ֻ; 加工方式: 贴片; 物料名称: 1206 180K 5% HS 贴片电阻; 规格型号: *
footprint R1206
pins: 1, 2
2 alternate drawings of the same symbol

## RES  1206  200K
designator R?, comment 200K
1206 200K 5% HS 贴片电阻; 物料代码: 3.01.03.01.05.0048; 助记码: 1206 200K 5% HS TPDZ; 仓库名称: 元件仓; 单位: ֻ; 加工方式: 贴片; 物料名称: 1206 200K 5% HS 贴片电阻; 规格型号: *
footprint R1206
pins: 1, 2
2 alternate drawings of the same symbol

## RES  1206  220K
designator R?, comment 220K
1206 220K 5% HS 贴片电阻; 助记码: 1206 220K 5% HS TPDZ; 物料代码: 3.01.03.01.05.0049; 仓库名称: 元件仓; 单位: ֻ; 加工方式: 贴片; 物料名称: 1206 220K 5% HS 贴片电阻; 规格型号: *
footprint R1206
pins: 1, 2
2 alternate drawings of the same symbol

## RES  1206  220R
designator R?, comment 220R
1206  220R  5%  HS  贴片电阻; 助记码: 1206  220R  5%  HS  TPDZ; 物料代码: 3.01.03.01.05.0011; 仓库名称: 元件仓; 单位: ֻ; 加工方式: 贴片; 物料名称: 1206  220R  5%  HS  贴片电阻; 规格型号: *
footprint R1206
pins: 1, 2
2 alternate drawings of the same symbol

## RES  1206  270K
designator R?, comment 270K
1206 270K 5% HS  贴片电阻; 助记码: 1206 270K 5% HS  TPDZ; 物料代码: 3.01.03.01.05.0050; 仓库名称: 元件仓; 单位: ֻ; 加工方式: 贴片; 物料名称: 1206 270K 5% HS  贴片电阻; 规格型号: *
footprint R1206
pins: 1, 2
2 alternate drawings of the same symbol

## RES  1206  270R
designator R?, comment 270R
1206 270R 5% HS 贴片电阻; 助记码: 1206 270R 5% HS TPDZ; 物料代码: 3.01.03.01.05.0012; 仓库名称: 元件仓; 单位: ֻ; 加工方式: 贴片; 物料名称: 1206 270R 5% HS 贴片电阻; 规格型号: *
footprint R1206
pins: 1, 2
2 alternate drawings of the same symbol

## RES  1206  330R
designator R?, comment 330R
1206  330R  5%  HS  贴片电阻; 物料代码: 3.01.03.01.05.0003; 仓库名称: 元件仓; 单位: ֻ; 加工方式: 贴片; 物料名称: 1206  330R  5%  HS  贴片电阻; 规格型号: *
footprint R1206
pins: 1, 2
2 alternate drawings of the same symbol

## RES  1206  360K
designator R?, comment 360K
1206 360K 5% HS 贴片电阻; 助记码: 1206 360K 5% HS TPDZ; 物料代码: 3.01.03.01.05.0051; 仓库名称: 元件仓; 单位: ֻ; 加工方式: 贴片; 物料名称: 1206 360K 5% HS 贴片电阻; 规格型号: *
footprint R1206
pins: 1, 2
2 alternate drawings of the same symbol

## RES  1206  430K
designator R?, comment 430K
1206 430K 5% HS 贴片电阻; 加工方式: 贴片; 物料代码: 3.01.03.01.05.0052; 助记码: 1206 430K 5% HS TPDZ; 仓库名称: 元件仓; 单位: ֻ; 物料名称: 1206 430K 5% HS 贴片电阻; 规格型号: *; 备注: *
footprint R1206
pins: 1, 2
2 alternate drawings of the same symbol

## RES  1206  470K
designator R?, comment 470K
1206 470K 5% HS 贴片电阻; 加工方式: 贴片; 物料代码: 3.01.03.01.05.0053; 助记码: 1206 470K 5% HS TPDZ; 仓库名称: 元件仓; 单位: ֻ; 物料名称: 1206 470K 5% HS 贴片电阻; 规格型号: *; 备注: *
footprint R1206
pins: 1, 2
2 alternate drawings of the same symbol

## RES  1206  470R
designator R?, comment 470R
（查不到）1206  470R  5%  HS  贴片电阻; 加工方式: 贴片; 仓库名称: 元件仓; 单位: ֻ; 物料代码: *; 物料名称: *; 助记码: *; 规格型号: *; 备注: *
footprint R1206
pins: 1, 2
2 alternate drawings of the same symbol

## RES  1206  560K
designator R?, comment 560K
1206 560K 5% HS 贴片电阻; 物料代码: 3.01.03.01.05.0054; 助记码: 1206 560K 5% HS TPDZ; 仓库名称: 元件仓; 单位: ֻ; 加工方式: 贴片; 物料名称: 1206 560K 5% HS 贴片电阻; 规格型号: *
footprint R1206
pins: 1, 2
2 alternate drawings of the same symbol

## RES  1206  560R
designator R?, comment 560R
1206 560R 5% HS 贴片电阻; 物料代码: 3.01.03.01.05.0013; 助记码: 1206 560R 5% HS TPDZ; 仓库名称: 元件仓; 单位: ֻ; 加工方式: 贴片; 物料名称: 1206 560R 5% HS 贴片电阻; 规格型号: *
footprint R1206
pins: 1, 2
2 alternate drawings of the same symbol

## RES  1206  680K
designator R?, comment 680K
1206 680K 5% HS  贴片电阻; 助记码: 1206 680K 5% HS  TPDZ; 物料代码: 3.01.03.01.05.0055; 仓库名称: 元件仓; 单位: ֻ; 加工方式: 贴片; 物料名称: 1206 680K 5% HS  贴片电阻; 规格型号: *
footprint R1206
pins: 1, 2
2 alternate drawings of the same symbol

## RES  1206  680R
designator R?, comment 680R
1206  680R  5%  HS  贴片电阻; 助记码: 1206  680R  5%  HS  TPDZ; 物料代码: 3.01.03.01.05.0014; 仓库名称: 元件仓; 单位: ֻ; 加工方式: 贴片; 物料名称: 1206  680R  5%  HS  贴片电阻; 规格型号: *
footprint R1206
pins: 1, 2
2 alternate drawings of the same symbol

## RES  RP 排阻SMT
designator RP?, comment RCML08W470FTG
RP 排阻SMT; 物料名称: *; 物料代码: *; 助记码: *; 规格型号: *; 单位: *; 备注: *; 加工方式: *; 仓库名称: *
pins: 1 TOP, 2 TOP, 3 TOP, 4 TOP, 5 BOT, 6 BOT, 7 BOT, 8 BOT
1 alternate drawing of the same symbol

## RES  氧化膜电阻  1K/1W
designator R?, comment 1K
1K/1W 氧化膜电阻(无 ); 仓库名称: 元件仓; 单位: ֻ; 加工方式: 插件; 物料名称: *; 物料代码: *; 助记码: *; 规格型号: *
footprint RS 1W (直插色环电阻，脚距15mm，直径4mm)
pins: 1, 2
2 alternate drawings of the same symbol

## RES  氧化膜电阻  1M/2W
designator R?, comment 1M
1M/2W 氧化膜电阻(无 ); 仓库名称: 元件仓; 单位: ֻ; 加工方式: 插件; 物料名称: *; 物料代码: *; 助记码: *; 规格型号: *
footprint RS 2W (直插色环电阻，脚距20mm，直径5mm)
pins: 1, 2
2 alternate drawings of the same symbol

## RES  氧化膜电阻  2.2K/3W
designator R?, comment 2.2K
2.2K/3W 氧化膜电阻(无 ); 仓库名称: 元件仓; 单位: ֻ; 加工方式: 插件; 物料名称: *; 物料代码: *; 助记码: *; 规格型号: *
footprint RS 3W (直插色环电阻，脚距25mm，直径6mm)
pins: 1, 2
2 alternate drawings of the same symbol

## RES  氧化膜电阻  2K/3W
designator R?, comment 2K
2K/3W 氧化膜电阻(无 ); 仓库名称: 元件仓; 单位: ֻ; 加工方式: 插件; 物料名称: *; 物料代码: *; 助记码: *; 规格型号: *
footprint RS 3W (直插色环电阻，脚距25mm，直径6mm)
pins: 1, 2
2 alternate drawings of the same symbol

## RES  氧化膜电阻  3R3/3W
designator R?, comment 3R3
3R3/3W 氧化膜电阻(无 ); 仓库名称: 元件仓; 单位: ֻ; 加工方式: 插件; 物料名称: *; 物料代码: *; 助记码: *; 规格型号: *
footprint RS 3W (直插色环电阻，脚距25mm，直径6mm)
pins: 1, 2
2 alternate drawings of the same symbol

## RES  氧化膜电阻  4.7K/3W
designator R?, comment 4.7K
4.7K/3W 氧化膜电阻(无 ); 仓库名称: 元件仓; 单位: ֻ; 加工方式: 插件; 物料名称: *; 物料代码: *; 助记码: *; 规格型号: *
footprint RS 3W (直插色环电阻，脚距25mm，直径6mm)
pins: 1, 2
2 alternate drawings of the same symbol

## RES  氧化膜电阻  6.8R/1W
designator R?, comment 6.8R
6.8R/1W 氧化膜电阻(无 ); 仓库名称: 元件仓; 单位: ֻ; 加工方式: 插件; 物料名称: *; 物料代码: *; 助记码: *; 规格型号: *
footprint RS 1W (直插色环电阻，脚距15mm，直径4mm)
pins: 1, 2
2 alternate drawings of the same symbol

## RES  氧化膜电阻  10K/1W
designator R?, comment 10K
10K/1W 氧化膜电阻(无 ); 仓库名称: 元件仓; 单位: ֻ; 加工方式: 插件; 物料名称: *; 物料代码: *; 助记码: *; 规格型号: *
footprint RS 1W (直插色环电阻，脚距15mm，直径4mm)
pins: 1, 2
2 alternate drawings of the same symbol
